# Altium footprint library CADTchip.PcbLib: 195 footprints (part 6 of 13)
Each footprint in its own frame and in the unit in brackets; x right, y up, seen from the top. Pads: shape width x height; smd on the part's side, far side on the other; paste and mask are expansions set on the pad; w line width, h text height; cw(c..) or ccw(c..) is an arc to the next point about the centre after c.
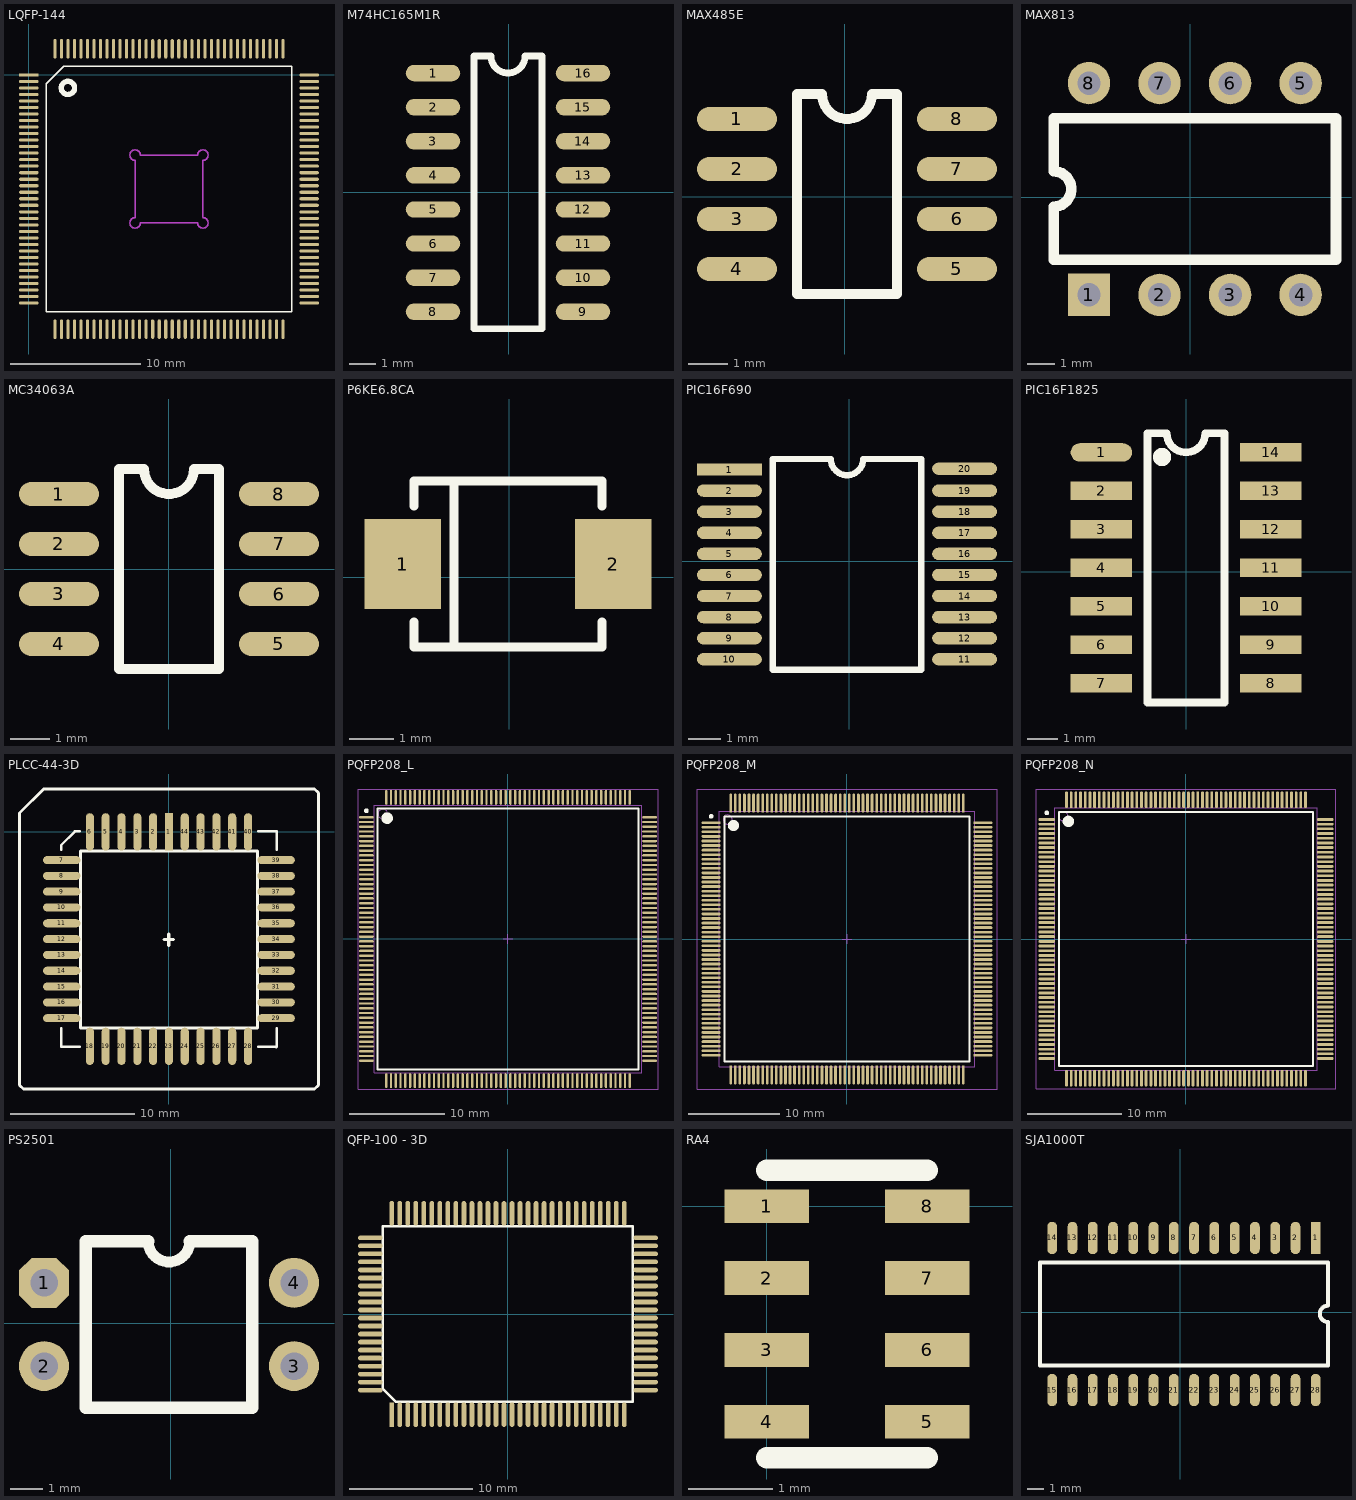
[diagram p5: the footprints below, top view; thin cyan lines are the x and y axes]

## LQFP-144 [mm]
pads (144):
  rect 1.5x0.24 smd: 1(0,0)
  oval 1.5x0.24 smd: 2(0,-0.5) 3(0,-1) 4(0,-1.5) 5(0,-2) 6(0,-2.5) 7(0,-3) 8(0,-3.5) 9(0,-4) 10(0,-4.5) 11(0,-5) 12(0,-5.5) 13(0,-6) 14(0,-6.5) 15(0,-7) 16(0,-7.5) 17(0,-8) 18(0,-8.5) 19(0,-9) 20(0,-9.5) 21(0,-10) 22(0,-10.5) 23(0,-11) 24(0,-11.5) 25(0,-12) 26(0,-12.5) 27(0,-13) 28(0,-13.5) 29(0,-14) 30(0,-14.5) 31(0,-15) 32(0,-15.5) 33(0,-16) 34(0,-16.5) 35(0,-17) 36(0,-17.5) 73(21.5,-17.5) 74(21.5,-17) 75(21.5,-16.5) 76(21.5,-16) 77(21.5,-15.5) 78(21.5,-15) 79(21.5,-14.5) 80(21.5,-14) 81(21.5,-13.5) 82(21.5,-13) 83(21.5,-12.5) 84(21.5,-12) 85(21.5,-11.5) 86(21.5,-11) 87(21.5,-10.5) 88(21.5,-10) 89(21.5,-9.5) 90(21.5,-9) 91(21.5,-8.5) 92(21.5,-8) 93(21.5,-7.5) 94(21.5,-7) 95(21.5,-6.5) 96(21.5,-6) 97(21.5,-5.5) 98(21.5,-5) 99(21.5,-4.5) 100(21.5,-4) 101(21.5,-3.5) 102(21.5,-3) 103(21.5,-2.5) 104(21.5,-2) 105(21.5,-1.5) 106(21.5,-1) 107(21.5,-0.5) 108(21.5,0)
  oval 0.24x1.5 smd: 37(2,-19.5) 38(2.5,-19.5) 39(3,-19.5) 40(3.5,-19.5) 41(4,-19.5) 42(4.5,-19.5) 43(5,-19.5) 44(5.5,-19.5) 45(6,-19.5) 46(6.5,-19.5) 47(7,-19.5) 48(7.5,-19.5) 49(8,-19.5) 50(8.5,-19.5) 51(9,-19.5) 52(9.5,-19.5) 53(10,-19.5) 54(10.5,-19.5) 55(11,-19.5) 56(11.5,-19.5) 57(12,-19.5) 58(12.5,-19.5) 59(13,-19.5) 60(13.5,-19.5) 61(14,-19.5) 62(14.5,-19.5) 63(15,-19.5) 64(15.5,-19.5) 65(16,-19.5) 66(16.5,-19.5) 67(17,-19.5) 68(17.5,-19.5) 69(18,-19.5) 70(18.5,-19.5) 71(19,-19.5) 72(19.5,-19.5) 109(19.5,2) 110(19,2) 111(18.5,2) 112(18,2) 113(17.5,2) 114(17,2) 115(16.5,2) 116(16,2) 117(15.5,2) 118(15,2) 119(14.5,2) 120(14,2) 121(13.5,2) 122(13,2) 123(12.5,2) 124(12,2) 125(11.5,2) 126(11,2) 127(10.5,2) 128(10,2) 129(9.5,2) 130(9,2) 131(8.5,2) 132(8,2) 133(7.5,2) 134(7,2) 135(6.5,2) 136(6,2) 137(5.5,2) 138(5,2) 139(4.5,2) 140(4,2) 141(3.5,2) 142(3,2) 143(2.5,2) 144(2,2)
Top Overlay:
  circle w0.406: c3,-1 r0.508
  lines w0.1: 1.335,-18.165 1.335,-0.67 2.67,0.665 20.165,0.665 20.165,-18.165 1.335,-18.165
Keep-Out Layer:
  lines w0.1: 12.95,-11.35 ccw(c13.35,-11.35) 13.35,-10.95 ; 12.954,-11.35 8.55,-11.35 cw(c8.15,-11.35) 8.15,-10.95 8.15,-6.55 cw(c8.15,-6.15) 8.55,-6.15 12.95,-6.15 cw(c13.35,-6.15) 13.35,-6.55 13.35,-10.922
Mechanical 1:
  lines w0.1: 12.95,-11.35 ccw(c13.35,-11.35) 13.35,-10.95 ; 12.954,-11.35 8.55,-11.35 cw(c8.15,-11.35) 8.15,-10.95 8.15,-6.55 cw(c8.15,-6.15) 8.55,-6.15 12.95,-6.15 cw(c13.35,-6.15) 13.35,-6.55 13.35,-10.922

## M74HC165M1R [mil]
pads (16):
  oval 80x24 smd: 1(-111.18,174.53) 2(-111.18,124.53) 3(-111.18,74.53) 4(-111.18,24.53) 5(-111.18,-25.47) 6(-111.18,-75.47) 7(-111.18,-125.47) 8(-111.18,-175.47) 9(108.82,-175.47) 10(108.82,-125.47) 11(108.82,-75.47) 12(108.82,-25.47) 13(108.82,24.53) 14(108.82,74.53) 15(108.82,124.53) 16(108.82,174.53)
Top Overlay:
  lines w10: -51.18,-200.47 -51.18,199.53 -26.18,199.53 ccw(c-1.18,199.53) 23.82,199.53 48.82,199.53 48.82,-200.47 -51.18,-200.47

## MAX485E [mil]
pads (8):
  oval 80x24 smd: 1(-107.8,77.68) 2(-107.8,27.68) 3(-107.8,-22.32) 4(-107.8,-72.32) 5(112.2,-72.32) 6(112.2,-22.32) 7(112.2,27.68) 8(112.2,77.68)
Top Overlay:
  lines w10: -47.8,-97.32 -47.8,102.68 -22.8,102.68 ccw(c2.2,102.68) 27.2,102.68 52.2,102.68 52.2,-97.32 -47.8,-97.32
3D body: height -15, standoff -81.93, extent -111.1,-93.46 125.12,99.46

## MAX813 [mil]
pads (8):
  rect 60x60 hole 33: 1(-143.83,-138)
  round 60 hole 33: 2(-43.83,-138) 3(56.17,-138) 4(156.17,-138) 5(156.17,162) 6(56.17,162) 7(-43.83,162) 8(-143.83,162)
Top Overlay:
  lines w15: -193.83,-88 -193.83,-13 ccw(c-193.83,12) -193.83,37 -193.83,112 206.17,112 206.17,-88 -193.83,-88

## MC34063A [mil]
pads (8):
  oval 80x24 smd: 1(-110,75) 2(-110,25) 3(-110,-25) 4(-110,-75) 5(110,-75) 6(110,-25) 7(110,25) 8(110,75)
Top Overlay:
  lines w10: -50,-100 50,-100 50,100 25,100 cw(c0,100) -25,100 -50,100 -50,-100
3D body: height -15, standoff -81.93, extent -118.1,-96.46 118.12,96.46

## P6KE6.8CA [mm]
pads (2):
  rect 1.7x2 smd: 1(-2.377,0.299) 2(2.323,0.299)
Top Overlay:
  lines w0.2: -2.127,-0.996 -2.127,-1.551 2.073,-1.551 2.073,-0.996 ; -2.127,1.594 -2.127,2.149 2.073,2.149 2.073,1.594 ; -1.238,-1.551 -1.238,2.149

## PIC16F690 [mm] "SSOP20"
pads (20):
  rect 2x0.38 smd: 1(-3.693,2.83)
  oval 2x0.38 smd: 2(-3.693,2.18) 3(-3.693,1.53) 4(-3.693,0.88) 5(-3.693,0.23) 6(-3.693,-0.42) 7(-3.693,-1.07) 8(-3.693,-1.72) 9(-3.693,-2.37) 10(-3.693,-3.02) 11(3.557,-3.02) 12(3.557,-2.37) 13(3.557,-1.72) 14(3.557,-1.07) 15(3.557,-0.42) 16(3.557,0.23) 17(3.557,0.88) 18(3.557,1.53) 19(3.557,2.18) 20(3.557,2.856)
Top Overlay:
  lines w0.2: -0.593,3.155 -2.358,3.155 -2.358,-3.345 2.222,-3.345 2.222,3.155 0.457,3.155 ; -0.568,3.155 ccw(c-0.068,3.155) 0.432,3.155

## PIC16F1825 [mil]
pads (14):
  oval 80x24 smd: 1(-110,155)
  rect 80x24 smd: 2(-110,105) 3(-110,55) 4(-110,5) 5(-110,-45) 6(-110,-95) 7(-110,-145) 8(110,-145) 9(110,-95) 10(110,-45) 11(110,5) 12(110,55) 13(110,105) 14(110,155)
Top Overlay:
  circle w11.81: c-31.26,149.09 r5.91
  lines w10: -50,-170 50,-170 50,180 25,180 cw(c0,180) -25,180 -50,180 -50,-170

## PLCC-44-3D [mm]
pads (44):
  rect 0.65x3 smd: 1(0,0)
  oval 0.65x3 smd: 2(-1.27,0) 3(-2.54,0) 4(-3.81,0) 5(-5.08,0) 6(-6.35,0) 18(-6.35,-17.216) 19(-5.08,-17.216) 20(-3.81,-17.216) 21(-2.54,-17.216) 22(-1.27,-17.216) 23(0,-17.216) 24(1.27,-17.216) 25(2.54,-17.216) 26(3.81,-17.216) 27(5.08,-17.216) 28(6.35,-17.216) 40(6.35,0) 41(5.08,0) 42(3.81,0) 43(2.54,0) 44(1.27,0)
  oval 3x0.65 smd: 7(-8.608,-2.258) 8(-8.608,-3.528) 9(-8.608,-4.798) 10(-8.608,-6.068) 11(-8.608,-7.338) 12(-8.608,-8.608) 13(-8.608,-9.878) 14(-8.608,-11.148) 15(-8.608,-12.418) 16(-8.608,-13.688) 17(-8.608,-14.958) 29(8.608,-14.958) 30(8.608,-13.688) 31(8.608,-12.418) 32(8.608,-11.148) 33(8.608,-9.878) 34(8.608,-8.608) 35(8.608,-7.338) 36(8.608,-6.068) 37(8.608,-4.798) 38(8.608,-3.528) 39(8.608,-2.258)
Top Overlay:
  lines w0.2: -8.65,-15.783 -8.65,-17.258 -7.175,-17.258 ; -8.65,-1.433 -8.65,-1.058 -7.55,0.042 -7.175,0.042 ; 7.175,-17.258 8.65,-17.258 8.65,-15.783 ; 7.175,0.042 8.65,0.042 8.65,-1.433
  lines w0.254: -0.375,-8.646 0.353,-8.646 ; -0.019,-9.121 -0.019,-8.206 ; 8.609,-17.258 8.65,-17.258 ; -11.995,-20.328 -11.679,-20.644 11.689,-20.644 12.005,-20.328 12.005,3.129 11.689,3.445 -10.066,3.445 -11.995,1.516 -11.995,0.5 -11.995,-20.328 ; -7.112,-15.752 -7.112,-1.528 7.112,-1.528 7.112,-15.752 -7.112,-15.752
3D body: height 4.39, standoff 0, extent -8.788,-17.423 8.737,0.102

## PQFP208_L [mm] "Shrink QFP, 208-Leads, Body 28x28mm, Pitch 0.5mm, IPC High Density"
height 4.1
pads (208):
  oval 1.55x0.25 smd: 1(-14.825,12.75) 2(-14.825,12.25) 3(-14.825,11.75) 4(-14.825,11.25) 5(-14.825,10.75) 6(-14.825,10.25) 7(-14.825,9.75) 8(-14.825,9.25) 9(-14.825,8.75) 10(-14.825,8.25) 11(-14.825,7.75) 12(-14.825,7.25) 13(-14.825,6.75) 14(-14.825,6.25) 15(-14.825,5.75) 16(-14.825,5.25) 17(-14.825,4.75) 18(-14.825,4.25) 19(-14.825,3.75) 20(-14.825,3.25) 21(-14.825,2.75) 22(-14.825,2.25) 23(-14.825,1.75) 24(-14.825,1.25) 25(-14.825,0.75) 26(-14.825,0.25) 27(-14.825,-0.25) 28(-14.825,-0.75) 29(-14.825,-1.25) 30(-14.825,-1.75) 31(-14.825,-2.25) 32(-14.825,-2.75) 33(-14.825,-3.25) 34(-14.825,-3.75) 35(-14.825,-4.25) 36(-14.825,-4.75) 37(-14.825,-5.25) 38(-14.825,-5.75) 39(-14.825,-6.25) 40(-14.825,-6.75) 41(-14.825,-7.25) 42(-14.825,-7.75) 43(-14.825,-8.25) 44(-14.825,-8.75) 45(-14.825,-9.25) 46(-14.825,-9.75) 47(-14.825,-10.25) 48(-14.825,-10.75) 49(-14.825,-11.25) 50(-14.825,-11.75) 51(-14.825,-12.25) 52(-14.825,-12.75) 105(14.825,-12.75) 106(14.825,-12.25) 107(14.825,-11.75) 108(14.825,-11.25) 109(14.825,-10.75) 110(14.825,-10.25) 111(14.825,-9.75) 112(14.825,-9.25) 113(14.825,-8.75) 114(14.825,-8.25) 115(14.825,-7.75) 116(14.825,-7.25) 117(14.825,-6.75) 118(14.825,-6.25) 119(14.825,-5.75) 120(14.825,-5.25) 121(14.825,-4.75) 122(14.825,-4.25) 123(14.825,-3.75) 124(14.825,-3.25) 125(14.825,-2.75) 126(14.825,-2.25) 127(14.825,-1.75) 128(14.825,-1.25) 129(14.825,-0.75) 130(14.825,-0.25) 131(14.825,0.25) 132(14.825,0.75) 133(14.825,1.25) 134(14.825,1.75) 135(14.825,2.25) 136(14.825,2.75) 137(14.825,3.25) 138(14.825,3.75) 139(14.825,4.25) 140(14.825,4.75) 141(14.825,5.25) 142(14.825,5.75) 143(14.825,6.25) 144(14.825,6.75) 145(14.825,7.25) 146(14.825,7.75) 147(14.825,8.25) 148(14.825,8.75) 149(14.825,9.25) 150(14.825,9.75) 151(14.825,10.25) 152(14.825,10.75) 153(14.825,11.25) 154(14.825,11.75) 155(14.825,12.25) 156(14.825,12.75)
  oval 0.25x1.55 smd: 53(-12.75,-14.825) 54(-12.25,-14.825) 55(-11.75,-14.825) 56(-11.25,-14.825) 57(-10.75,-14.825) 58(-10.25,-14.825) 59(-9.75,-14.825) 60(-9.25,-14.825) 61(-8.75,-14.825) 62(-8.25,-14.825) 63(-7.75,-14.825) 64(-7.25,-14.825) 65(-6.75,-14.825) 66(-6.25,-14.825) 67(-5.75,-14.825) 68(-5.25,-14.825) 69(-4.75,-14.825) 70(-4.25,-14.825) 71(-3.75,-14.825) 72(-3.25,-14.825) 73(-2.75,-14.825) 74(-2.25,-14.825) 75(-1.75,-14.825) 76(-1.25,-14.825) 77(-0.75,-14.825) 78(-0.25,-14.825) 79(0.25,-14.825) 80(0.75,-14.825) 81(1.25,-14.825) 82(1.75,-14.825) 83(2.25,-14.825) 84(2.75,-14.825) 85(3.25,-14.825) 86(3.75,-14.825) 87(4.25,-14.825) 88(4.75,-14.825) 89(5.25,-14.825) 90(5.75,-14.825) 91(6.25,-14.825) 92(6.75,-14.825) 93(7.25,-14.825) 94(7.75,-14.825) 95(8.25,-14.825) 96(8.75,-14.825) 97(9.25,-14.825) 98(9.75,-14.825) 99(10.25,-14.825) 100(10.75,-14.825) 101(11.25,-14.825) 102(11.75,-14.825) 103(12.25,-14.825) 104(12.75,-14.825) 157(12.75,14.825) 158(12.25,14.825) 159(11.75,14.825) 160(11.25,14.825) 161(10.75,14.825) 162(10.25,14.825) 163(9.75,14.825) 164(9.25,14.825) 165(8.75,14.825) 166(8.25,14.825) 167(7.75,14.825) 168(7.25,14.825) 169(6.75,14.825) 170(6.25,14.825) 171(5.75,14.825) 172(5.25,14.825) 173(4.75,14.825) 174(4.25,14.825) 175(3.75,14.825) 176(3.25,14.825) 177(2.75,14.825) 178(2.25,14.825) 179(1.75,14.825) 180(1.25,14.825) 181(0.75,14.825) 182(0.25,14.825) 183(-0.25,14.825) 184(-0.75,14.825) 185(-1.25,14.825) 186(-1.75,14.825) 187(-2.25,14.825) 188(-2.75,14.825) 189(-3.25,14.825) 190(-3.75,14.825) 191(-4.25,14.825) 192(-4.75,14.825) 193(-5.25,14.825) 194(-5.75,14.825) 195(-6.25,14.825) 196(-6.75,14.825) 197(-7.25,14.825) 198(-7.75,14.825) 199(-8.25,14.825) 200(-8.75,14.825) 201(-9.25,14.825) 202(-9.75,14.825) 203(-10.25,14.825) 204(-10.75,14.825) 205(-11.25,14.825) 206(-11.75,14.825) 207(-12.25,14.825) 208(-12.75,14.825)
Top Overlay:
  circle w0.6: c-12.65,12.65 r0.3
  circle w0.25: c-14.825,13.425 r0.125
  lines w0.2: -13.65,-13.65 13.65,-13.65 13.65,13.65 -13.65,13.65 -13.65,-13.65
Mechanical 13:
  circle w0.1: c-13.1,13.1 r0.5
  lines w0.1: -14,-14 14,-14 14,14 -14,14 -14,-14
Mechanical 15:
  lines w0.1: -0.5,0 0.5,0 ; 0,-0.5 0,0.5 ; -15.7,-15.7 15.7,-15.7 15.7,15.7 -15.7,15.7 -15.7,-15.7
3D body: height 3.5, standoff 0, extent -15.318,-15.269 15.267,15.316

## PQFP208_M [mm] "Shrink QFP, 208-Leads, Body 28x28mm, Pitch 0.5mm, IPC Low Density"
height 4.1
pads (208):
  oval 2.1x0.3 smd: 1(-14.9,12.75) 2(-14.9,12.25) 3(-14.9,11.75) 4(-14.9,11.25) 5(-14.9,10.75) 6(-14.9,10.25) 7(-14.9,9.75) 8(-14.9,9.25) 9(-14.9,8.75) 10(-14.9,8.25) 11(-14.9,7.75) 12(-14.9,7.25) 13(-14.9,6.75) 14(-14.9,6.25) 15(-14.9,5.75) 16(-14.9,5.25) 17(-14.9,4.75) 18(-14.9,4.25) 19(-14.9,3.75) 20(-14.9,3.25) 21(-14.9,2.75) 22(-14.9,2.25) 23(-14.9,1.75) 24(-14.9,1.25) 25(-14.9,0.75) 26(-14.9,0.25) 27(-14.9,-0.25) 28(-14.9,-0.75) 29(-14.9,-1.25) 30(-14.9,-1.75) 31(-14.9,-2.25) 32(-14.9,-2.75) 33(-14.9,-3.25) 34(-14.9,-3.75) 35(-14.9,-4.25) 36(-14.9,-4.75) 37(-14.9,-5.25) 38(-14.9,-5.75) 39(-14.9,-6.25) 40(-14.9,-6.75) 41(-14.9,-7.25) 42(-14.9,-7.75) 43(-14.9,-8.25) 44(-14.9,-8.75) 45(-14.9,-9.25) 46(-14.9,-9.75) 47(-14.9,-10.25) 48(-14.9,-10.75) 49(-14.9,-11.25) 50(-14.9,-11.75) 51(-14.9,-12.25) 52(-14.9,-12.75) 105(14.9,-12.75) 106(14.9,-12.25) 107(14.9,-11.75) 108(14.9,-11.25) 109(14.9,-10.75) 110(14.9,-10.25) 111(14.9,-9.75) 112(14.9,-9.25) 113(14.9,-8.75) 114(14.9,-8.25) 115(14.9,-7.75) 116(14.9,-7.25) 117(14.9,-6.75) 118(14.9,-6.25) 119(14.9,-5.75) 120(14.9,-5.25) 121(14.9,-4.75) 122(14.9,-4.25) 123(14.9,-3.75) 124(14.9,-3.25) 125(14.9,-2.75) 126(14.9,-2.25) 127(14.9,-1.75) 128(14.9,-1.25) 129(14.9,-0.75) 130(14.9,-0.25) 131(14.9,0.25) 132(14.9,0.75) 133(14.9,1.25) 134(14.9,1.75) 135(14.9,2.25) 136(14.9,2.75) 137(14.9,3.25) 138(14.9,3.75) 139(14.9,4.25) 140(14.9,4.75) 141(14.9,5.25) 142(14.9,5.75) 143(14.9,6.25) 144(14.9,6.75) 145(14.9,7.25) 146(14.9,7.75) 147(14.9,8.25) 148(14.9,8.75) 149(14.9,9.25) 150(14.9,9.75) 151(14.9,10.25) 152(14.9,10.75) 153(14.9,11.25) 154(14.9,11.75) 155(14.9,12.25) 156(14.9,12.75)
  oval 0.3x2.1 smd: 53(-12.75,-14.9) 54(-12.25,-14.9) 55(-11.75,-14.9) 56(-11.25,-14.9) 57(-10.75,-14.9) 58(-10.25,-14.9) 59(-9.75,-14.9) 60(-9.25,-14.9) 61(-8.75,-14.9) 62(-8.25,-14.9) 63(-7.75,-14.9) 64(-7.25,-14.9) 65(-6.75,-14.9) 66(-6.25,-14.9) 67(-5.75,-14.9) 68(-5.25,-14.9) 69(-4.75,-14.9) 70(-4.25,-14.9) 71(-3.75,-14.9) 72(-3.25,-14.9) 73(-2.75,-14.9) 74(-2.25,-14.9) 75(-1.75,-14.9) 76(-1.25,-14.9) 77(-0.75,-14.9) 78(-0.25,-14.9) 79(0.25,-14.9) 80(0.75,-14.9) 81(1.25,-14.9) 82(1.75,-14.9) 83(2.25,-14.9) 84(2.75,-14.9) 85(3.25,-14.9) 86(3.75,-14.9) 87(4.25,-14.9) 88(4.75,-14.9) 89(5.25,-14.9) 90(5.75,-14.9) 91(6.25,-14.9) 92(6.75,-14.9) 93(7.25,-14.9) 94(7.75,-14.9) 95(8.25,-14.9) 96(8.75,-14.9) 97(9.25,-14.9) 98(9.75,-14.9) 99(10.25,-14.9) 100(10.75,-14.9) 101(11.25,-14.9) 102(11.75,-14.9) 103(12.25,-14.9) 104(12.75,-14.9) 157(12.75,14.9) 158(12.25,14.9) 159(11.75,14.9) 160(11.25,14.9) 161(10.75,14.9) 162(10.25,14.9) 163(9.75,14.9) 164(9.25,14.9) 165(8.75,14.9) 166(8.25,14.9) 167(7.75,14.9) 168(7.25,14.9) 169(6.75,14.9) 170(6.25,14.9) 171(5.75,14.9) 172(5.25,14.9) 173(4.75,14.9) 174(4.25,14.9) 175(3.75,14.9) 176(3.25,14.9) 177(2.75,14.9) 178(2.25,14.9) 179(1.75,14.9) 180(1.25,14.9) 181(0.75,14.9) 182(0.25,14.9) 183(-0.25,14.9) 184(-0.75,14.9) 185(-1.25,14.9) 186(-1.75,14.9) 187(-2.25,14.9) 188(-2.75,14.9) 189(-3.25,14.9) 190(-3.75,14.9) 191(-4.25,14.9) 192(-4.75,14.9) 193(-5.25,14.9) 194(-5.75,14.9) 195(-6.25,14.9) 196(-6.75,14.9) 197(-7.25,14.9) 198(-7.75,14.9) 199(-8.25,14.9) 200(-8.75,14.9) 201(-9.25,14.9) 202(-9.75,14.9) 203(-10.25,14.9) 204(-10.75,14.9) 205(-11.25,14.9) 206(-11.75,14.9) 207(-12.25,14.9) 208(-12.75,14.9)
Top Overlay:
  circle w0.25: c-14.9,13.45 r0.125
  circle w0.6: c-12.45,12.45 r0.3
  lines w0.2: -13.45,-13.45 -13.45,13.45 13.45,13.45 13.45,-13.45 -13.45,-13.45
Mechanical 13:
  circle w0.1: c-13.1,13.1 r0.5
  lines w0.1: -14,-14 -14,14 14,14 14,-14 -14,-14
Mechanical 15:
  lines w0.1: -0.5,0 0.5,0 ; 0,-0.5 0,0.5 ; -16.45,-16.45 -16.45,16.45 16.45,16.45 16.45,-16.45 -16.45,-16.45
3D body: height 3.5, standoff 0, extent -15.32,-15.318 15.265,15.267

## PQFP208_N [mm] "Shrink QFP, 208-Leads, Body 28x28mm, Pitch 0.5mm, IPC Medium Density"
height 4.1
pads (208):
  oval 1.8x0.3 smd: 1(-14.85,12.75) 2(-14.85,12.25) 3(-14.85,11.75) 4(-14.85,11.25) 5(-14.85,10.75) 6(-14.85,10.25) 7(-14.85,9.75) 8(-14.85,9.25) 9(-14.85,8.75) 10(-14.85,8.25) 11(-14.85,7.75) 12(-14.85,7.25) 13(-14.85,6.75) 14(-14.85,6.25) 15(-14.85,5.75) 16(-14.85,5.25) 17(-14.85,4.75) 18(-14.85,4.25) 19(-14.85,3.75) 20(-14.85,3.25) 21(-14.85,2.75) 22(-14.85,2.25) 23(-14.85,1.75) 24(-14.85,1.25) 25(-14.85,0.75) 26(-14.85,0.25) 27(-14.85,-0.25) 28(-14.85,-0.75) 29(-14.85,-1.25) 30(-14.85,-1.75) 31(-14.85,-2.25) 32(-14.85,-2.75) 33(-14.85,-3.25) 34(-14.85,-3.75) 35(-14.85,-4.25) 36(-14.85,-4.75) 37(-14.85,-5.25) 38(-14.85,-5.75) 39(-14.85,-6.25) 40(-14.85,-6.75) 41(-14.85,-7.25) 42(-14.85,-7.75) 43(-14.85,-8.25) 44(-14.85,-8.75) 45(-14.85,-9.25) 46(-14.85,-9.75) 47(-14.85,-10.25) 48(-14.85,-10.75) 49(-14.85,-11.25) 50(-14.85,-11.75) 51(-14.85,-12.25) 52(-14.85,-12.75) 105(14.85,-12.75) 106(14.85,-12.25) 107(14.85,-11.75) 108(14.85,-11.25) 109(14.85,-10.75) 110(14.85,-10.25) 111(14.85,-9.75) 112(14.85,-9.25) 113(14.85,-8.75) 114(14.85,-8.25) 115(14.85,-7.75) 116(14.85,-7.25) 117(14.85,-6.75) 118(14.85,-6.25) 119(14.85,-5.75) 120(14.85,-5.25) 121(14.85,-4.75) 122(14.85,-4.25) 123(14.85,-3.75) 124(14.85,-3.25) 125(14.85,-2.75) 126(14.85,-2.25) 127(14.85,-1.75) 128(14.85,-1.25) 129(14.85,-0.75) 130(14.85,-0.25) 131(14.85,0.25) 132(14.85,0.75) 133(14.85,1.25) 134(14.85,1.75) 135(14.85,2.25) 136(14.85,2.75) 137(14.85,3.25) 138(14.85,3.75) 139(14.85,4.25) 140(14.85,4.75) 141(14.85,5.25) 142(14.85,5.75) 143(14.85,6.25) 144(14.85,6.75) 145(14.85,7.25) 146(14.85,7.75) 147(14.85,8.25) 148(14.85,8.75) 149(14.85,9.25) 150(14.85,9.75) 151(14.85,10.25) 152(14.85,10.75) 153(14.85,11.25) 154(14.85,11.75) 155(14.85,12.25) 156(14.85,12.75)
  oval 0.3x1.8 smd: 53(-12.75,-14.85) 54(-12.25,-14.85) 55(-11.75,-14.85) 56(-11.25,-14.85) 57(-10.75,-14.85) 58(-10.25,-14.85) 59(-9.75,-14.85) 60(-9.25,-14.85) 61(-8.75,-14.85) 62(-8.25,-14.85) 63(-7.75,-14.85) 64(-7.25,-14.85) 65(-6.75,-14.85) 66(-6.25,-14.85) 67(-5.75,-14.85) 68(-5.25,-14.85) 69(-4.75,-14.85) 70(-4.25,-14.85) 71(-3.75,-14.85) 72(-3.25,-14.85) 73(-2.75,-14.85) 74(-2.25,-14.85) 75(-1.75,-14.85) 76(-1.25,-14.85) 77(-0.75,-14.85) 78(-0.25,-14.85) 79(0.25,-14.85) 80(0.75,-14.85) 81(1.25,-14.85) 82(1.75,-14.85) 83(2.25,-14.85) 84(2.75,-14.85) 85(3.25,-14.85) 86(3.75,-14.85) 87(4.25,-14.85) 88(4.75,-14.85) 89(5.25,-14.85) 90(5.75,-14.85) 91(6.25,-14.85) 92(6.75,-14.85) 93(7.25,-14.85) 94(7.75,-14.85) 95(8.25,-14.85) 96(8.75,-14.85) 97(9.25,-14.85) 98(9.75,-14.85) 99(10.25,-14.85) 100(10.75,-14.85) 101(11.25,-14.85) 102(11.75,-14.85) 103(12.25,-14.85) 104(12.75,-14.85) 157(12.75,14.85) 158(12.25,14.85) 159(11.75,14.85) 160(11.25,14.85) 161(10.75,14.85) 162(10.25,14.85) 163(9.75,14.85) 164(9.25,14.85) 165(8.75,14.85) 166(8.25,14.85) 167(7.75,14.85) 168(7.25,14.85) 169(6.75,14.85) 170(6.25,14.85) 171(5.75,14.85) 172(5.25,14.85) 173(4.75,14.85) 174(4.25,14.85) 175(3.75,14.85) 176(3.25,14.85) 177(2.75,14.85) 178(2.25,14.85) 179(1.75,14.85) 180(1.25,14.85) 181(0.75,14.85) 182(0.25,14.85) 183(-0.25,14.85) 184(-0.75,14.85) 185(-1.25,14.85) 186(-1.75,14.85) 187(-2.25,14.85) 188(-2.75,14.85) 189(-3.25,14.85) 190(-3.75,14.85) 191(-4.25,14.85) 192(-4.75,14.85) 193(-5.25,14.85) 194(-5.75,14.85) 195(-6.25,14.85) 196(-6.75,14.85) 197(-7.25,14.85) 198(-7.75,14.85) 199(-8.25,14.85) 200(-8.75,14.85) 201(-9.25,14.85) 202(-9.75,14.85) 203(-10.25,14.85) 204(-10.75,14.85) 205(-11.25,14.85) 206(-11.75,14.85) 207(-12.25,14.85) 208(-12.75,14.85)
Top Overlay:
  circle w0.25: c-14.85,13.45 r0.125
  circle w0.6: c-12.55,12.55 r0.3
  lines w0.2: -13.55,-13.55 -13.55,13.55 13.55,13.55 13.55,-13.55 -13.55,-13.55
Mechanical 13:
  circle w0.1: c-13.1,13.1 r0.5
  lines w0.1: -14,-14 -14,14 14,14 14,-14 -14,-14
Mechanical 15:
  lines w0.1: -0.5,0 0.5,0 ; 0,-0.5 0,0.5 ; -16,-16 -16,16 16,16 16,-16 -16,-16
3D body: height 3.5, standoff 0, extent -15.269,-15.32 15.316,15.265

## PS2501 [mil] "DIP"
pads (4):
  oct 60x60 hole 33: 1(-152,48.81)
  round 60 hole 33: 2(-152,-51.19) 3(148,-51.19) 4(148,48.81)
Top Overlay:
  lines w13: -27,98.81 ccw(c-2,98.81) 23,98.81
  lines w15: -27,98.81 -102,98.81 -102,-101.19 98,-101.19 98,98.81 23,98.81

## QFP-100 - 3D [mm]
pads (100):
  rect 0.381x2 smd: 1(-9.425,-8.16)
  oval 0.381x2 smd: 2(-8.775,-8.16) 3(-8.125,-8.16) 4(-7.475,-8.16) 5(-6.825,-8.16) 6(-6.175,-8.16) 7(-5.525,-8.16) 8(-4.875,-8.16) 9(-4.225,-8.16) 10(-3.575,-8.16) 11(-2.925,-8.16) 12(-2.275,-8.16) 13(-1.625,-8.16) 14(-0.975,-8.16) 15(-0.325,-8.16) 16(0.325,-8.16) 17(0.975,-8.16) 18(1.625,-8.16) 19(2.275,-8.16) 20(2.925,-8.16) 21(3.575,-8.16) 22(4.225,-8.16) 23(4.875,-8.16) 24(5.525,-8.16) 25(6.175,-8.16) 26(6.825,-8.16) 27(7.475,-8.16) 28(8.125,-8.16) 29(8.775,-8.16) 30(9.425,-8.16) 51(9.425,8.16) 52(8.775,8.16) 53(8.125,8.16) 54(7.475,8.16) 55(6.825,8.16) 56(6.175,8.16) 57(5.525,8.16) 58(4.875,8.16) 59(4.225,8.16) 60(3.575,8.16) 61(2.925,8.16) 62(2.275,8.16) 63(1.625,8.16) 64(0.975,8.16) 65(0.325,8.16) 66(-0.325,8.16) 67(-0.975,8.16) 68(-1.625,8.16) 69(-2.275,8.16) 70(-2.925,8.16) 71(-3.575,8.16) 72(-4.225,8.16) 73(-4.875,8.16) 74(-5.525,8.16) 75(-6.175,8.16) 76(-6.825,8.16) 77(-7.475,8.16) 78(-8.125,8.16) 79(-8.775,8.16) 80(-9.425,8.16)
  oval 2x0.381 smd: 31(11.16,-6.175) 32(11.16,-5.525) 33(11.16,-4.875) 34(11.16,-4.225) 35(11.16,-3.575) 36(11.16,-2.925) 37(11.16,-2.275) 38(11.16,-1.625) 39(11.16,-0.975) 40(11.16,-0.325) 41(11.16,0.325) 42(11.16,0.975) 43(11.16,1.625) 44(11.16,2.275) 45(11.16,2.925) 46(11.16,3.575) 47(11.16,4.225) 48(11.16,4.875) 49(11.16,5.525) 50(11.16,6.175) 81(-11.16,6.175) 82(-11.16,5.525) 83(-11.16,4.875) 84(-11.16,4.225) 85(-11.16,3.575) 86(-11.16,2.925) 87(-11.16,2.275) 88(-11.16,1.625) 89(-11.16,0.975) 90(-11.16,0.325) 91(-11.16,-0.325) 92(-11.16,-0.975) 93(-11.16,-1.625) 94(-11.16,-2.275) 95(-11.16,-2.925) 96(-11.16,-3.575) 97(-11.16,-4.225) 98(-11.16,-4.875) 99(-11.16,-5.525) 100(-11.16,-6.175)
Top Overlay:
  lines w0.2: -10.136,-6.084 -10.136,7.131 ; -10.13,-6.084 -9.095,-7.119 ; -10.125,7.125 10.125,7.125 10.125,-7.125 -9.09,-7.125
3D body: height 1.6, standoff -0.05, extent -10.998,-7.994 10.997,8.001

## RA4 [mm]
pads (8):
  rect 1x0.4 smd: 1(0,0) 2(0,-0.85) 3(0,-1.7) 4(0,-2.55) 5(1.9,-2.55) 6(1.9,-1.7) 7(1.9,-0.85) 8(1.9,0)
Top Overlay:
  lines w0.254: 0,-2.975 1.9,-2.975 ; 0,0.425 1.9,0.425
3D body: height 0.55, standoff 0, extent 0.152,-2.87 1.752,0.33

## SJA1000T [mil]
pads (28):
  rect 24x80 smd: 1(334,183)
  oval 24x80 smd: 2(284,183) 3(234,183) 4(184,183) 5(134,183) 6(84,183) 7(34,183) 8(-16,183) 9(-66,183) 10(-116,183) 11(-166,183) 12(-216,183) 13(-266,183) 14(-316,183) 15(-316,-192) 16(-266,-192) 17(-216,-192) 18(-166,-192) 19(-116,-192) 20(-66,-192) 21(-16,-192) 22(34,-192) 23(84,-192) 24(134,-192) 25(184,-192) 26(234,-192) 27(284,-192) 28(334,-192)
Top Overlay:
  lines w10: -346,-132 -346,123 364,123 364,16 ccw(c364,-4) 364,-24 364,-132 -346,-132